# Altium footprint library MH_DA_THU_VIEN_16122016.PcbLib: 531 footprints (part 2 of 34)
Each footprint in its own frame and in the unit in brackets; x right, y up, seen from the top. Pads: shape width x height; smd on the part's side, far side on the other; paste and mask are expansions set on the pad; w line width, h text height; cw(c..) or ccw(c..) is an arc to the next point about the centre after c.
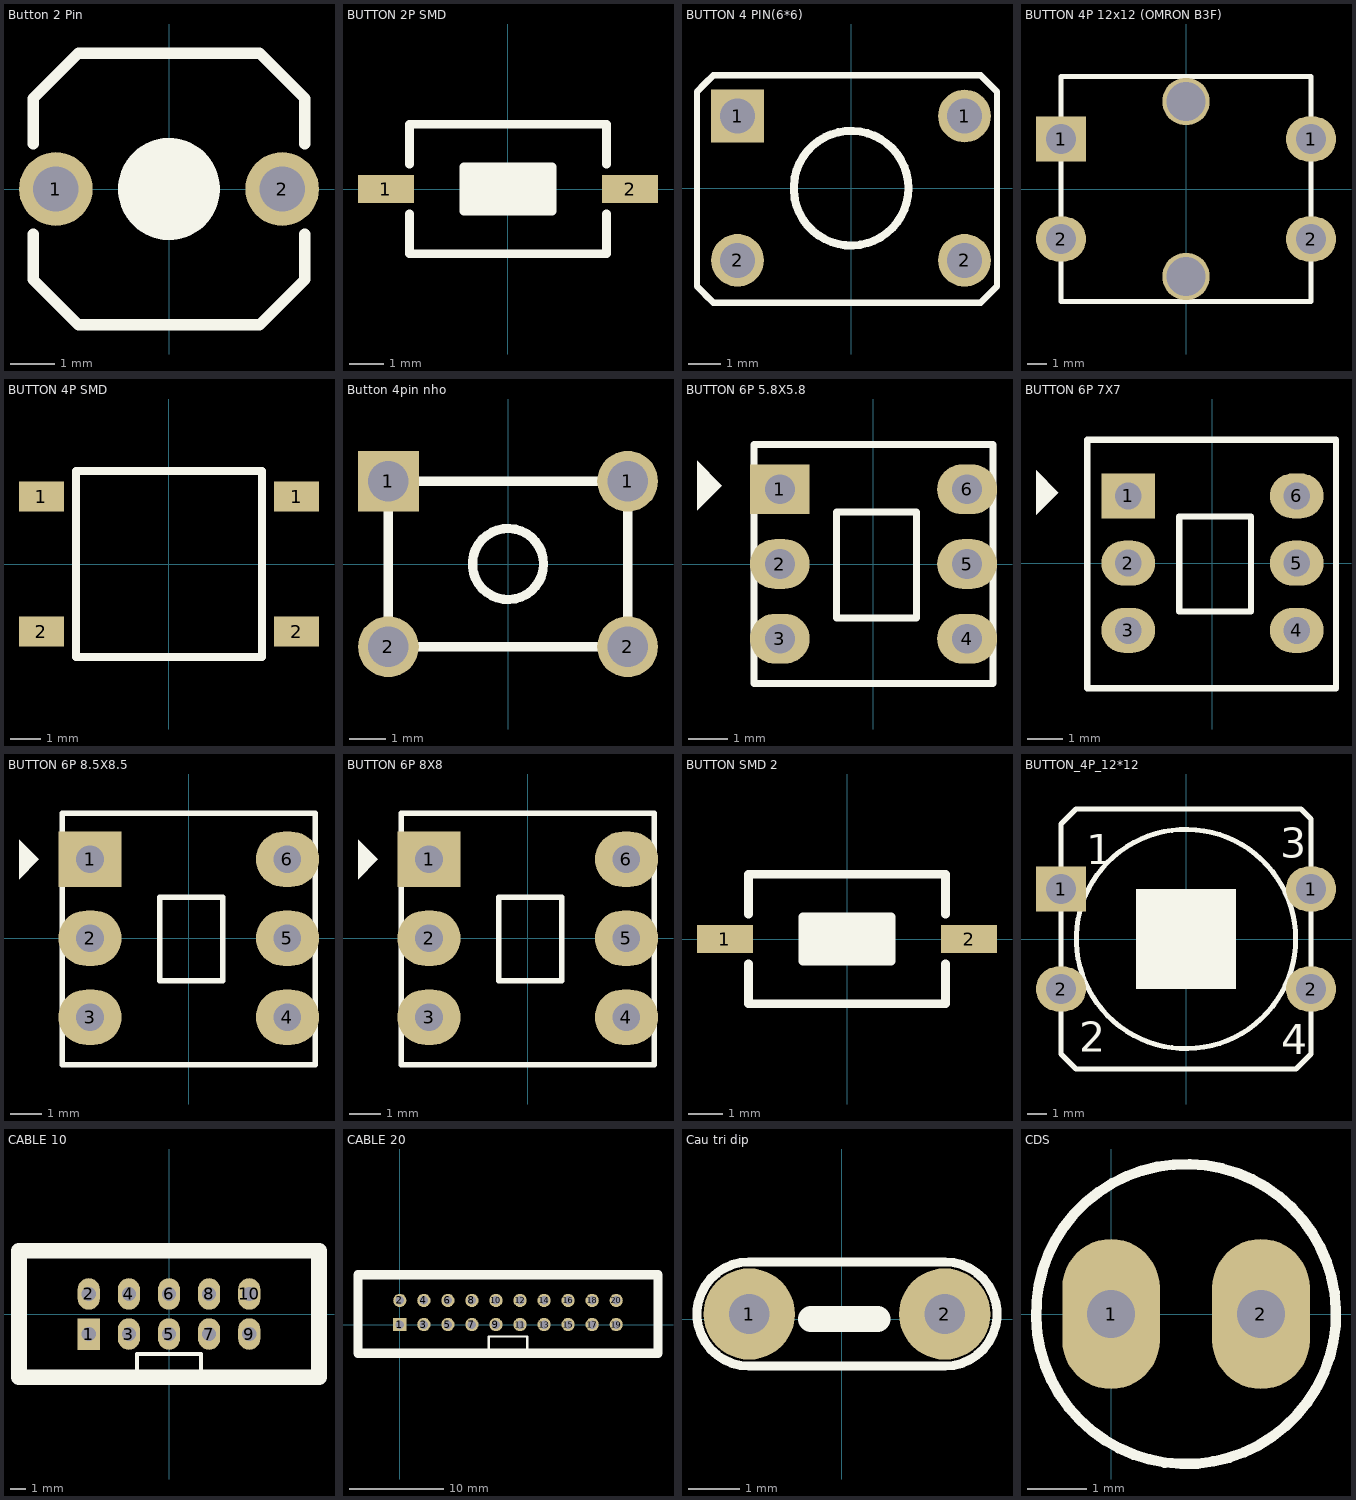
[diagram p1: the footprints below, top view; thin cyan lines are the x and y axes]

## Button 2 Pin [mil] "Button 200mil 2 Pin"
pads (2):
  round 65 hole 40: 1(-100,0) 2(100,0)
Top Overlay:
  circle w50: c0,0 r20
  lines w10: -120,-40 -120,-80 -80,-120 80,-120 120,-80 120,-40 ; -120,40 -120,80 -80,120 80,120 120,80 120,40

## BUTTON 2P SMD [mm]
pads (2):
  rect 1.6x0.8 smd: 1(-3.5,0) 2(3.5,0)
Top Overlay:
  rectangle: -1.27,-0.635 1.27,0.635
  lines w0.254: -2.819,-0.711 -2.819,-1.854 2.819,-1.854 2.819,-0.711 ; -2.819,0.711 -2.819,1.854 2.819,1.854 2.819,0.711 ; -1.27,-0.635 -1.27,0.635 1.27,0.635 1.27,-0.635 -1.27,-0.635
3D body: height 2.5, standoff 0, extent -3.05,-1.85 3.05,1.85

## BUTTON 4 PIN(6*6) [mil] "BUTTON SMORE 280mil x 178mil"
height 100
pads (4):
  rect 65x65 hole 43.31: 1(-140,89)
  round 65 hole 43.31: 1(140,89) 2(-140,-89) 2(140,-89)
Top Overlay:
  circle w10: c0,0 r70.71
  lines w8: -180,-131 -170,-141 ; -170,-141 -190,-121 -190,119 -180,129 -170,139 -160,139 160,139 180,119 180,-121 160,-141 -170,-141
3D body: height 275.59, standoff -137.8, extent -158.51,-124.04 152.51,120.05

## BUTTON 4P 12x12 (OMRON B3F) [mil]
pads (6):
  rect 100x90 hole 60: 1(-250,100)
  oval 100x90 hole 60: 1(250,100) 2(-250,-100) 2(250,-100)
  round 94.49 hole 78.74: ""(0,-175) ""(0,175)
Top Overlay:
  lines w10: -250.5,-225 -250.5,225 249.5,225 249.5,-225 -250.5,-225
3D body: height 374.02, standoff -137.8, extent -272.59,-236.22 273.6,236.22

## BUTTON 4P SMD [mm]
pads (4):
  rect 1.5x1 smd: 1(-4.25,2.25) 1(4.25,2.25) 2(-4.25,-2.25) 2(4.25,-2.25)
Top Overlay:
  lines w0.254: -3.1,-3.1 3.1,-3.1 3.1,3.1 -3.1,3.1 -3.1,-3.1

## Button 4pin nho [mm]
pads (4):
  rect 1.651x1.651 hole 1.1: 1(-3.25,2.25)
  round 1.651 hole 1.1: 1(3.25,2.25) 2(-3.25,-2.25) 2(3.25,-2.25)
Top Overlay:
  circle w0.254: c0,0 r0.966
  lines w0.254: -3.25,-1.399 -3.25,1.399 ; -2.425,-2.25 2.425,-2.25 ; -2.425,2.25 2.425,2.25 ; 3.25,-1.399 3.25,1.399

## BUTTON 6P 5.8X5.8 [mil]
pads (6):
  rect 60x50 hole 30: 1(-94,75)
  oval 60x50 hole 30: 2(-94,0) 3(-94,-75) 4(94,-75) 5(94,0) 6(94,75)
Top Overlay:
  region: -177.17,103.74 -152.17,78.74 -177.17,53.74
  lines w7: -120,-120 120,-120 120,120 -120,120 -120,-120 ; -37,-54 -37,52 43,52 43,-54 -37,-54

## BUTTON 6P 7X7 [mil]
pads (6):
  rect 60x50 hole 30: 1(-94,75)
  oval 60x50 hole 30: 2(-94,0) 3(-94,-75) 4(94,-75) 5(94,0) 6(94,75)
Top Overlay:
  region: -196.85,103.74 -171.85,78.74 -196.85,53.74
  lines w7: -139.69,-139.69 137.8,-139.69 137.8,137.8 -139.69,137.8 -139.69,-139.69 ; -37,-54 43,-54 43,52 -37,52 -37,-54

## BUTTON 6P 8.5X8.5 [mil]
pads (6):
  rect 80x70 hole 35: 1(-125,100)
  oval 80x70 hole 35: 2(-125,0) 3(-125,-100) 4(125,-100) 5(125,0) 6(125,100)
Top Overlay:
  region: -215,125 -190,100 -215,75
  lines w7: -160,-160 160,-160 160,158 -160,158 -160,-160 ; -37,-54 43,-54 43,52 -37,52 -37,-54
3D body: height 532.1, standoff -137.19, extent -158.48,-159.48 156.48,155.49

## BUTTON 6P 8X8 [mil]
pads (6):
  rect 80x70 hole 35: 1(-125,100)
  oval 80x70 hole 35: 2(-125,0) 3(-125,-100) 4(125,-100) 5(125,0) 6(125,100)
Top Overlay:
  region: -215,125 -190,100 -215,75
  lines w7: -160,-160 -160,158 160,158 160,-160 -160,-160 ; -37,-54 -37,52 43,52 43,-54 -37,-54
3D body: height 532.1, standoff -137.19, extent -158.48,-159.48 156.48,155.49

## BUTTON SMD 2 [mm]
pads (2):
  rect 1.6x0.8 smd: 1(-3.5,0) 2(3.5,0)
Top Overlay:
  rectangle: -1.27,-0.635 1.27,0.635
  lines w0.254: -2.819,-0.711 -2.819,-1.854 2.819,-1.854 2.819,-0.711 ; -2.819,0.711 -2.819,1.854 2.819,1.854 2.819,0.711 ; -1.27,-0.635 -1.27,0.635 1.27,0.635 1.27,-0.635 -1.27,-0.635
3D body: height 2.5, standoff 0, extent -3.05,-1.85 3.05,1.85

## BUTTON_4P_12*12 [mil] "Nut an to"
pads (4):
  rect 100x90 hole 60: 1(-250,100)
  oval 100x90 hole 60: 1(250,100) 2(-250,-100) 2(250,-100)
Top Overlay:
  circle w10: c0,0 r219.32
  rectangle: -100,-100 100,100
  lines w10: -250,-140 -250,-230 -220,-260 220,-260 250,-230 250,-140 ; -250,-60 -250,60 ; -250,140 -250,230 -220,260 230,260 250,240 250,140 ; 250,-60 250,60
  text "1" at -200,150 h60
  text "2" at -214,-225 h60
  text "3" at 188,163 h60
  text "4" at 190,-230 h60
3D body: height 514.38, standoff 0.6, extent -239.73,-237.14 232.72,235.3

## CABLE 10 [mm] "Connector; Header; 5x2 Position"
pads (10):
  rect 1.4x2 hole 0.9: 1(-5.08,-1.27)
  oval 1.4x2 hole 0.9: 2(-5.08,1.27) 3(-2.54,-1.27) 4(-2.54,1.27) 5(0,-1.27) 6(0,1.27) 7(2.54,-1.27) 8(2.54,1.27) 9(5.08,-1.27) 10(5.08,1.27)
Top Overlay:
  lines w0.254: -2.032,-3.556 -2.032,-2.54 1.778,-2.54 2.032,-2.54 2.032,-3.556
  lines w1: -9.5,-4 -9.5,4 9.5,4 9.5,-4 -9.5,-4
3D body: height 9.86, standoff -3.05, extent -10.16,-4.572 10.16,4.572

## CABLE 20 [mm] "Connector; Header; 5x2 Position"
pads (20):
  rect 1.4x1.4 hole 0.9: 1(0,0)
  round 1.4 hole 0.9: 2(0,2.54) 3(2.54,0) 4(2.54,2.54) 5(5.08,0) 6(5.08,2.54) 7(7.62,0) 8(7.62,2.54) 9(10.16,0) 10(10.16,2.54) 11(12.7,0) 12(12.7,2.54) 13(15.24,0) 14(15.24,2.54) 15(17.78,0) 16(17.78,2.54) 17(20.32,0) 18(20.32,2.54) 19(22.86,0) 20(22.86,2.54)
Top Overlay:
  lines w0.254: 9.398,-2.54 9.398,-1.27 13.462,-1.27 13.462,-2.794
  lines w1: 8.28,-3.048 27.28,-3.048 27.28,5.27 8.28,5.27 ; 14.58,-3.048 -4.42,-3.048 -4.42,5.27 14.58,5.27
3D body: height 9.3, standoff -2.5, extent -5.02,-3.63 27.88,5.77

## Cau tri dip [mil]
pads (2):
  round 70 hole 31: 1(-70.87,3.94) 2(79.13,3.94)
Top Overlay:
  lines w7: -70.87,-36.06 cw(c-70.87,3.94) -70.87,43.94 79.13,43.94 cw(c79.13,3.94) 79.13,-36.06 -70.87,-36.06
  lines w20: -23.62,0 27.56,0
3D body: height 235, standoff -76.85, extent -110.73,-29.45 119.14,37.34

## CDS [mil] "QUANG TRO"
height 300
pads (2):
  oval 65x100 hole 32: 1(0,0) 2(100,0)
Top Overlay:
  lines w7: 136.62,-49.97 cw(c50,0) 137.42,-48.56